# Altium integrated library LEMO Unipole And Multipole Type Connectors.IntLib: 1566 symbols (part 5 of 13) (continued)
## ERA.2E.306.CLN (continued)
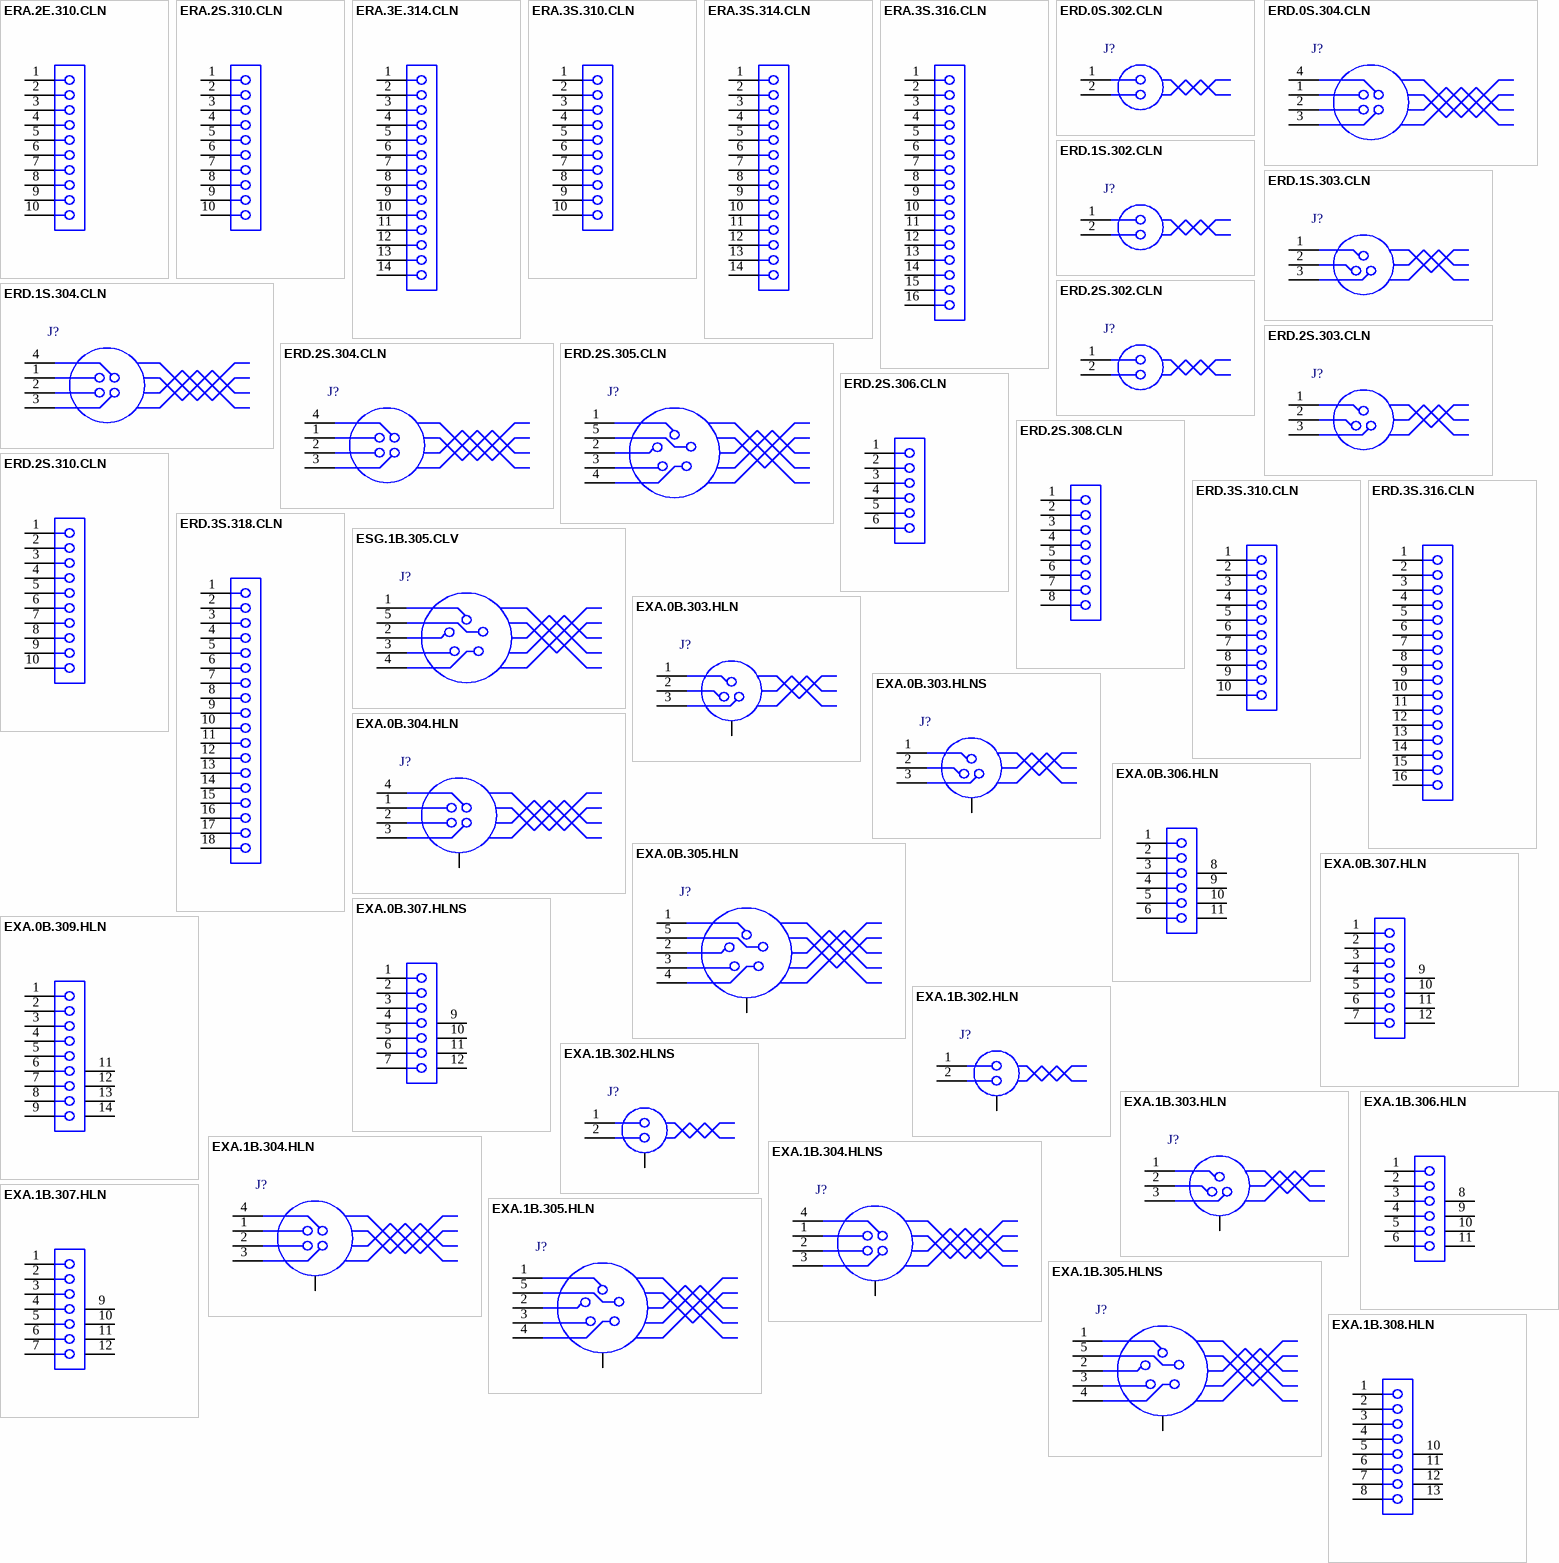
[diagram p15: symbols ERA.2E.310.CLN to EXA.1B.308.HLN]

## ERA.2E.310.CLN
designator J?
Fixed receptacle, nut fixing, Key (A), 2E series, Multipole Type with 10 Contacts; Manufacturer: LEMO; PartNumber: ERA.2E.310.CLN; Number of contacts: 10; Contact Diameter: 0.9 mm; AWG: 22; Rated Current(A): 7; DatasheetVersion: Jun-14; PackageReference: ERA.2E.310.CLN; PackageDescription: Fixed receptacle, nut fixing, Key(A) for Printed Circuit; ComponentLink1Description: Manufacturer URL; ComponentLink1URL: http://www.lemo.com; ComponentLink2Description: Datasheet; ComponentLink2URL: http://intra.lemo.ch/catalog/ROW/UK_English/unipole_multipole.pdf
footprint ERA.2E.310.CLN (Socket, Female, Body 20mm dia., Through hole)
pins: 1, 2, 3, 4, 5, 6, 7, 8, 9, 10

## ERA.2S.310.CLN
designator J?
Fixed receptacle, nut fixing, 2S series, Multipole Type with 10 Contacts; Manufacturer: LEMO; PartNumber: ERA.2S.310.CLN; Number of contacts: 10; Contact Diameter: 0.9 mm; AWG: 22; Rated Current(A): 7; DatasheetVersion: Jun-14; PackageReference: ERA.2S.310.CLN; PackageDescription: Fixed receptacle, nut fixing,  for Printed Circuit; Supplier 1: Mouser; Supplier Part Number 1: 736-ERA2S310CLN; Supplier 2: Digi-Key; Supplier Part Number 2: ERA.2S.310.CLN-ND; ComponentLink1Description: Manufacturer URL; ComponentLink1URL: http://www.lemo.com; ComponentLink2Description: Datasheet; ComponentLink2URL: http://intra.lemo.ch/catalog/ROW/UK_English/unipole_multipole.pdf
footprint ERA.2S.310.CLN (Socket, Female, Body 15mm dia., Through hole)
pins: 1, 2, 3, 4, 5, 6, 7, 8, 9, 10

## ERA.3E.314.CLN
designator J?
Fixed receptacle, nut fixing, Key (A), 3E series, Multipole Type with 14 Contacts; Manufacturer: LEMO; PartNumber: ERA.3E.314.CLN; Number of contacts: 14; Contact Diameter: 0.9 mm; AWG: 22; Rated Current(A): 7; DatasheetVersion: Jun-14; PackageReference: ERA.3E.314.CLN; PackageDescription: Fixed receptacle, nut fixing, Key(A) for Printed Circuit; ComponentLink1Description: Manufacturer URL; ComponentLink1URL: http://www.lemo.com; ComponentLink2Description: Datasheet; ComponentLink2URL: http://intra.lemo.ch/catalog/ROW/UK_English/unipole_multipole.pdf
footprint ERA.3E.314.CLN (Socket, Female, Body 24mm dia., Through hole)
pins: 1, 2, 3, 4, 5, 6, 7, 8, 9, 10, 11, 12, 13, 14

## ERA.3S.310.CLN
designator J?
Fixed receptacle, nut fixing, 3S series, Multipole Type with 10 Contacts; Manufacturer: LEMO; PartNumber: ERA.3S.310.CLN; Number of contacts: 10; Contact Diameter: 1.3 mm; AWG: 20; Rated Current(A): 9; DatasheetVersion: Jun-14; PackageReference: ERA.3S.310.CLN; PackageDescription: Fixed receptacle, nut fixing,  for Printed Circuit; ComponentLink1Description: Manufacturer URL; ComponentLink1URL: http://www.lemo.com; ComponentLink2Description: Datasheet; ComponentLink2URL: http://intra.lemo.ch/catalog/ROW/UK_English/unipole_multipole.pdf
footprint ERA.3S.310.CLN (Socket, Female, Body 18mm dia., Through hole)
pins: 1, 2, 3, 4, 5, 6, 7, 8, 9, 10

## ERA.3S.314.CLN
designator J?
Fixed receptacle, nut fixing, 3S series, Multipole Type with 14 Contacts; Manufacturer: LEMO; PartNumber: ERA.3S.314.CLN; Number of contacts: 14; Contact Diameter: 0.9 mm; AWG: 22; Rated Current(A): 7; DatasheetVersion: Jun-14; PackageReference: ERA.3S.314.CLN; PackageDescription: Fixed receptacle, nut fixing,  for Printed Circuit; ComponentLink1Description: Manufacturer URL; ComponentLink1URL: http://www.lemo.com; ComponentLink2Description: Datasheet; ComponentLink2URL: http://intra.lemo.ch/catalog/ROW/UK_English/unipole_multipole.pdf
footprint ERA.3S.314.CLN (Socket, Female, Body 18mm dia., Through hole)
pins: 1, 2, 3, 4, 5, 6, 7, 8, 9, 10, 11, 12, 13, 14

## ERA.3S.316.CLN
designator J?
Fixed receptacle, nut fixing, 3S series, Multipole Type with 16 Contacts; Manufacturer: LEMO; PartNumber: ERA.3S.316.CLN; Number of contacts: 16; Contact Diameter: 0.9 mm; AWG: 22; Rated Current(A): 7; DatasheetVersion: Jun-14; PackageReference: ERA.3S.316.CLN; PackageDescription: Fixed receptacle, nut fixing,  for Printed Circuit; ComponentLink1Description: Manufacturer URL; ComponentLink1URL: http://www.lemo.com; ComponentLink2Description: Datasheet; ComponentLink2URL: http://intra.lemo.ch/catalog/ROW/UK_English/unipole_multipole.pdf
footprint ERA.3S.316.CLN (Socket, Female, Body 18mm dia., Through hole)
pins: 1, 2, 3, 4, 5, 6, 7, 8, 9, 10, 11, 12, 13, 14, 15, 16

## ERD.0S.302.CLN
designator J?
Fixed receptacle with two nuts (back panel mounting), 0S series, Multipole Type with 2 Contacts; Manufacturer: LEMO; PartNumber: ERD.0S.302.CLN; Number of contacts: 2; Contact Diameter: 0.9 mm; AWG: 22; Rated Current(A): 10; DatasheetVersion: Jun-14; PackageReference: ERD.0S.302.CLN; PackageDescription: Fixed receptacle with two nuts (back panel mounting),  for Printed Circuit; Supplier 1: Mouser; Supplier Part Number 1: 736-ERD0S302CLN; Supplier 2: Digi-Key; Supplier Part Number 2: ERD.0S.302.CLN-ND; ComponentLink1Description: Manufacturer URL; ComponentLink1URL: http://www.lemo.com; ComponentLink2Description: Datasheet; ComponentLink2URL: http://intra.lemo.ch/catalog/ROW/UK_English/unipole_multipole.pdf
footprint ERD.0S.302.CLN (Socket, Female, Body 9mm dia., Through hole)
pins: 1, 2

## ERD.0S.304.CLN
designator J?
Fixed receptacle with two nuts (back panel mounting), 0S series, Multipole Type with 4 Contacts; Manufacturer: LEMO; PartNumber: ERD.0S.304.CLN; Number of contacts: 4; Contact Diameter: 0.7 mm; AWG: 24; Rated Current(A): 7; DatasheetVersion: Jun-14; PackageReference: ERD.0S.304.CLN; PackageDescription: Fixed receptacle with two nuts (back panel mounting),  for Printed Circuit; Supplier 1: Mouser; Supplier Part Number 1: 736-ERD0S304CLN; Supplier 2: Digi-Key; Supplier Part Number 2: ERD.0S.304.CLN-ND; ComponentLink1Description: Manufacturer URL; ComponentLink1URL: http://www.lemo.com; ComponentLink2Description: Datasheet; ComponentLink2URL: http://intra.lemo.ch/catalog/ROW/UK_English/unipole_multipole.pdf
footprint ERD.0S.304.CLN (Socket, Female, Body 9mm dia., Through hole)
pins: 1, 2, 3, 4

## ERD.1S.302.CLN
designator J?
Fixed receptacle with two nuts (back panel mounting), 1S series, Multipole Type with 2 Contacts; Manufacturer: LEMO; PartNumber: ERD.1S.302.CLN; Number of contacts: 2; Contact Diameter: 1.3 mm; AWG: 20; Rated Current(A): 15; DatasheetVersion: Jun-14; PackageReference: ERD.1S.302.CLN; PackageDescription: Fixed receptacle with two nuts (back panel mounting),  for Printed Circuit; Supplier 1: Mouser; Supplier Part Number 1: 736-ERD1S302CLN; Supplier 2: Digi-Key; Supplier Part Number 2: ERD.1S.302.CLN-ND; ComponentLink1Description: Manufacturer URL; ComponentLink1URL: http://www.lemo.com; ComponentLink2Description: Datasheet; ComponentLink2URL: http://intra.lemo.ch/catalog/ROW/UK_English/unipole_multipole.pdf
footprint ERD.1S.302.CLN (Socket, Female, Body 12mm dia., Through hole)
pins: 1, 2

## ERD.1S.303.CLN
designator J?
Fixed receptacle with two nuts (back panel mounting), 1S series, Multipole Type with 3 Contacts; Manufacturer: LEMO; PartNumber: ERD.1S.303.CLN; Number of contacts: 3; Contact Diameter: 0.9 mm; AWG: 22; Rated Current(A): 10; DatasheetVersion: Jun-14; PackageReference: ERD.1S.303.CLN; PackageDescription: Fixed receptacle with two nuts (back panel mounting),  for Printed Circuit; Supplier 1: Mouser; Supplier Part Number 1: 736-ERD1S303CLN; Supplier 2: Digi-Key; Supplier Part Number 2: ERD.1S.303.CLN-ND; ComponentLink1Description: Manufacturer URL; ComponentLink1URL: http://www.lemo.com; ComponentLink2Description: Datasheet; ComponentLink2URL: http://intra.lemo.ch/catalog/ROW/UK_English/unipole_multipole.pdf
footprint ERD.1S.303.CLN (Socket, Female, Body 12mm dia., Through hole)
pins: 1, 2, 3

## ERD.1S.304.CLN
designator J?
Fixed receptacle with two nuts (back panel mounting), 1S series, Multipole Type with 4 Contacts; Manufacturer: LEMO; PartNumber: ERD.1S.304.CLN; Number of contacts: 4; Contact Diameter: 0.9 mm; AWG: 22; Rated Current(A): 10; DatasheetVersion: Jun-14; PackageReference: ERD.1S.304.CLN; PackageDescription: Fixed receptacle with two nuts (back panel mounting),  for Printed Circuit; ComponentLink1Description: Manufacturer URL; ComponentLink1URL: http://www.lemo.com; ComponentLink2Description: Datasheet; ComponentLink2URL: http://intra.lemo.ch/catalog/ROW/UK_English/unipole_multipole.pdf
footprint ERD.1S.304.CLN (Socket, Female, Body 12mm dia., Through hole)
pins: 1, 2, 3, 4

## ERD.2S.302.CLN
designator J?
Fixed receptacle with two nuts (back panel mounting), 2S series, Multipole Type with 2 Contacts; Manufacturer: LEMO; PartNumber: ERD.2S.302.CLN; Number of contacts: 2; AWG: 16; Rated Current(A): 20; DatasheetVersion: Jun-14; PackageReference: ERD.2S.302.CLN; PackageDescription: Fixed receptacle with two nuts (back panel mounting),  for Printed Circuit; ComponentLink1Description: Manufacturer URL; ComponentLink1URL: http://www.lemo.com; ComponentLink2Description: Datasheet; ComponentLink2URL: http://intra.lemo.ch/catalog/ROW/UK_English/unipole_multipole.pdf
footprint ERD.2S.302.CLN (Socket, Female, Body 15mm dia., Through hole)
pins: 1, 2

## ERD.2S.303.CLN
designator J?
Fixed receptacle with two nuts (back panel mounting), 2S series, Multipole Type with 3 Contacts; Manufacturer: LEMO; PartNumber: ERD.2S.303.CLN; Number of contacts: 3; Contact Diameter: 1.3 mm; AWG: 20; Rated Current(A): 15; DatasheetVersion: Jun-14; PackageReference: ERD.2S.303.CLN; PackageDescription: Fixed receptacle with two nuts (back panel mounting),  for Printed Circuit; ComponentLink1Description: Manufacturer URL; ComponentLink1URL: http://www.lemo.com; ComponentLink2Description: Datasheet; ComponentLink2URL: http://intra.lemo.ch/catalog/ROW/UK_English/unipole_multipole.pdf
footprint ERD.2S.303.CLN (Socket, Female, Body 15mm dia., Through hole)
pins: 1, 2, 3

## ERD.2S.304.CLN
designator J?
Fixed receptacle with two nuts (back panel mounting), 2S series, Multipole Type with 4 Contacts; Manufacturer: LEMO; PartNumber: ERD.2S.304.CLN; Number of contacts: 4; Contact Diameter: 1.3 mm; AWG: 20; Rated Current(A): 15; DatasheetVersion: Jun-14; PackageReference: ERD.2S.304.CLN; PackageDescription: Fixed receptacle with two nuts (back panel mounting),  for Printed Circuit; ComponentLink1Description: Manufacturer URL; ComponentLink1URL: http://www.lemo.com; ComponentLink2Description: Datasheet; ComponentLink2URL: http://intra.lemo.ch/catalog/ROW/UK_English/unipole_multipole.pdf
footprint ERD.2S.304.CLN (Socket, Female, Body 15mm dia., Through hole)
pins: 1, 2, 3, 4

## ERD.2S.305.CLN
designator J?
Fixed receptacle with two nuts (back panel mounting), 2S series, Multipole Type with 5 Contacts; Manufacturer: LEMO; PartNumber: ERD.2S.305.CLN; Number of contacts: 5; Contact Diameter: 1.3 mm; AWG: 20; Rated Current(A): 13; DatasheetVersion: Jun-14; PackageReference: ERD.2S.305.CLN; PackageDescription: Fixed receptacle with two nuts (back panel mounting),  for Printed Circuit; ComponentLink1Description: Manufacturer URL; ComponentLink1URL: http://www.lemo.com; ComponentLink2Description: Datasheet; ComponentLink2URL: http://intra.lemo.ch/catalog/ROW/UK_English/unipole_multipole.pdf
footprint ERD.2S.305.CLN (Socket, Female, Body 15mm dia., Through hole)
pins: 1, 2, 3, 4, 5

## ERD.2S.306.CLN
designator J?
Fixed receptacle with two nuts (back panel mounting), 2S series, Multipole Type with 6 Contacts; Manufacturer: LEMO; PartNumber: ERD.2S.306.CLN; Number of contacts: 6; Contact Diameter: 1.3 mm; AWG: 20; Rated Current(A): 12; DatasheetVersion: Jun-14; PackageReference: ERD.2S.306.CLN; PackageDescription: Fixed receptacle with two nuts (back panel mounting),  for Printed Circuit; Supplier 1: Mouser; Supplier Part Number 1: 736-ERD2S306CLN; Supplier 2: Digi-Key; Supplier Part Number 2: ERD.2S.306.CLN-ND; ComponentLink1Description: Manufacturer URL; ComponentLink1URL: http://www.lemo.com; ComponentLink2Description: Datasheet; ComponentLink2URL: http://intra.lemo.ch/catalog/ROW/UK_English/unipole_multipole.pdf
footprint ERD.2S.306.CLN (Socket, Female, Body 15mm dia., Through hole)
pins: 1, 2, 3, 4, 5, 6

## ERD.2S.308.CLN
designator J?
Fixed receptacle with two nuts (back panel mounting), 2S series, Multipole Type with 8 Contacts; Manufacturer: LEMO; PartNumber: ERD.2S.308.CLN; Number of contacts: 8; Contact Diameter: 0.9 mm; AWG: 22; Rated Current(A): 9; DatasheetVersion: Jun-14; PackageReference: ERD.2S.308.CLN; PackageDescription: Fixed receptacle with two nuts (back panel mounting),  for Printed Circuit; ComponentLink1Description: Manufacturer URL; ComponentLink1URL: http://www.lemo.com; ComponentLink2Description: Datasheet; ComponentLink2URL: http://intra.lemo.ch/catalog/ROW/UK_English/unipole_multipole.pdf
footprint ERD.2S.308.CLN (Socket, Female, Body 15mm dia., Through hole)
pins: 1, 2, 3, 4, 5, 6, 7, 8

## ERD.2S.310.CLN
designator J?
Fixed receptacle with two nuts (back panel mounting), 2S series, Multipole Type with 10 Contacts; Manufacturer: LEMO; PartNumber: ERD.2S.310.CLN; Number of contacts: 10; Contact Diameter: 0.9 mm; AWG: 22; Rated Current(A): 7; DatasheetVersion: Jun-14; PackageReference: ERD.2S.310.CLN; PackageDescription: Fixed receptacle with two nuts (back panel mounting),  for Printed Circuit; Supplier 1: Mouser; Supplier Part Number 1: 736-ERD2S310CLN; Supplier 2: Digi-Key; Supplier Part Number 2: ERD.2S.310.CLN-ND; ComponentLink1Description: Manufacturer URL; ComponentLink1URL: http://www.lemo.com; ComponentLink2Description: Datasheet; ComponentLink2URL: http://intra.lemo.ch/catalog/ROW/UK_English/unipole_multipole.pdf
footprint ERD.2S.310.CLN (Socket, Female, Body 15mm dia., Through hole)
pins: 1, 2, 3, 4, 5, 6, 7, 8, 9, 10

## ERD.3S.310.CLN
designator J?
Fixed receptacle with two nuts (back panel mounting), 3S series, Multipole Type with 10 Contacts; Manufacturer: LEMO; PartNumber: ERD.3S.310.CLN; Number of contacts: 10; Contact Diameter: 1.3 mm; AWG: 20; Rated Current(A): 9; DatasheetVersion: Jun-14; PackageReference: ERD.3S.310.CLN; PackageDescription: Fixed receptacle with two nuts (back panel mounting),  for Printed Circuit; Supplier 1: Mouser; Supplier Part Number 1: 736-ERD3S310CLN; Supplier 2: Digi-Key; Supplier Part Number 2: ERD.3S.310.CLN-ND; ComponentLink1Description: Manufacturer URL; ComponentLink1URL: http://www.lemo.com; ComponentLink2Description: Datasheet; ComponentLink2URL: http://intra.lemo.ch/catalog/ROW/UK_English/unipole_multipole.pdf
footprint ERD.3S.310.CLN (Socket, Female, Body 18mm dia., Through hole)
pins: 1, 2, 3, 4, 5, 6, 7, 8, 9, 10

## ERD.3S.316.CLN
designator J?
Fixed receptacle with two nuts (back panel mounting), 3S series, Multipole Type with 16 Contacts; Manufacturer: LEMO; PartNumber: ERD.3S.316.CLN; Number of contacts: 16; Contact Diameter: 0.9 mm; AWG: 22; Rated Current(A): 7; DatasheetVersion: Jun-14; PackageReference: ERD.3S.316.CLN; PackageDescription: Fixed receptacle with two nuts (back panel mounting),  for Printed Circuit; Supplier 1: Mouser; Supplier Part Number 1: 736-ERD3S316CLN; Supplier 2: Digi-Key; Supplier Part Number 2: ERD.3S.316.CLN-ND; ComponentLink1Description: Manufacturer URL; ComponentLink1URL: http://www.lemo.com; ComponentLink2Description: Datasheet; ComponentLink2URL: http://intra.lemo.ch/catalog/ROW/UK_English/unipole_multipole.pdf
footprint ERD.3S.316.CLN (Socket, Female, Body 18mm dia., Through hole)
pins: 1, 2, 3, 4, 5, 6, 7, 8, 9, 10, 11, 12, 13, 14, 15, 16

## ERD.3S.318.CLN
designator J?
Fixed receptacle with two nuts (back panel mounting), 3S series, Multipole Type with 18 Contacts; Manufacturer: LEMO; PartNumber: ERD.3S.318.CLN; Number of contacts: 18; Contact Diameter: 0.9 mm; AWG: 22; Rated Current(A): 6; DatasheetVersion: Jun-14; PackageReference: ERD.3S.318.CLN; PackageDescription: Fixed receptacle with two nuts (back panel mounting),  for Printed Circuit; ComponentLink1Description: Manufacturer URL; ComponentLink1URL: http://www.lemo.com; ComponentLink2Description: Datasheet; ComponentLink2URL: http://intra.lemo.ch/catalog/ROW/UK_English/unipole_multipole.pdf
footprint ERD.3S.318.CLN (Socket, Female, Body 18mm dia., Through hole)
pins: 1, 2, 3, 4, 5, 6, 7, 8, 9, 10, 11, 12, 13, 14, 15, 16, 17, 18

## ESG.1B.305.CLV
designator J?
Fixed receptacle with two round nuts, long threaded shell (back panel mounting), Key (G), 1B series, Multipole Type with 5 Contacts; Manufacturer: LEMO; PartNumber: ESG.1B.305.CLV; Number of contacts: 5; Contact Diameter: 0.9 mm; AWG: 22; Rated Current(A): 6; DatasheetVersion: Jun-14; PackageReference: ESG.1B.305.CLV; PackageDescription: Fixed receptacle with two round nuts, long threaded shell (back panel mounting), Key(G) for Printed Circuit; ComponentLink1Description: Manufacturer URL; ComponentLink1URL: http://www.lemo.com; ComponentLink2Description: Datasheet; ComponentLink2URL: http://intra.lemo.ch/catalog/ROW/UK_English/unipole_multipole.pdf
footprint ESG.1B.305.CLV (Socket, Female, Body 12mm dia. Height 21.1 mm, Through hole)
pins: 1, 2, 3, 4, 5

## EXA.0B.303.HLN
designator J?
Elbow receptacle for printed circuit with two nuts (solder or screw fixing, back panel mounting), Key (A), 0B series, Multipole Type with 3 Contacts; Manufacturer: LEMO; PartNumber: EXA.0B.303.HLN; Number of contacts: 3; Contact Diameter: 0.9 mm; AWG: 22; Rated Current(A): 6; DatasheetVersion: Jun-14; PackageReference: EXA.0B.303.HLN; PackageDescription: Elbow receptacle for printed circuit with two nuts (solder or screw fixing, back panel mounting), Key(A) for Printed Circuit; Supplier 1: Mouser; Supplier Part Number 1: 736-EXA0B303HLN; Supplier 2: Digi-Key; Supplier Part Number 2: EXA.0B.303.HLN-ND; ComponentLink1Description: Manufacturer URL; ComponentLink1URL: http://www.lemo.com; ComponentLink2Description: Datasheet; ComponentLink2URL: http://intra.lemo.ch/catalog/ROW/UK_English/unipole_multipole.pdf
footprint EXA.0B.303.HLN (Socket, Female, Body 9mm dia. Height 10.5 mm, Through hole)
pins: 1, 2, 3, 5, 6, 7, 8

## EXA.0B.303.HLNS
designator J?
Elbow receptacle for printed circuit with two nuts (solder or screw fixing, back panel mounting), Key (A), 0B series, Multipole Type with 3 Contacts; Manufacturer: LEMO; PartNumber: EXA.0B.303.HLNS; Number of contacts: 3; Contact Diameter: 0.9 mm; AWG: 22; Rated Current(A): 6; DatasheetVersion: Jun-14; PackageReference: EXA.0B.303.HLNS; PackageDescription: Elbow receptacle for printed circuit with two nuts (solder or screw fixing, back panel mounting), Key(A) for Printed Circuit; ComponentLink1Description: Manufacturer URL; ComponentLink1URL: http://www.lemo.com; ComponentLink2Description: Datasheet; ComponentLink2URL: http://intra.lemo.ch/catalog/ROW/UK_English/unipole_multipole.pdf
footprint EXA.0B.303.HLNS (Socket, Female, Body 9mm dia. Height 10.5 mm, Through hole)
pins: 1, 2, 3, 5, 6, 7, 8

## EXA.0B.304.HLN
designator J?
Elbow receptacle for printed circuit with two nuts (solder or screw fixing, back panel mounting), Key (A), 0B series, Multipole Type with 4 Contacts; Manufacturer: LEMO; PartNumber: EXA.0B.304.HLN; Number of contacts: 4; Contact Diameter: 0.7 mm; AWG: 24; Rated Current(A): 6; DatasheetVersion: Jun-14; PackageReference: EXA.0B.304.HLN; PackageDescription: Elbow receptacle for printed circuit with two nuts (solder or screw fixing, back panel mounting), Key(A) for Printed Circuit; Supplier 1: Mouser; Supplier Part Number 1: 736-EXA0B304HLN; Supplier 2: Digi-Key; Supplier Part Number 2: EXA.0B.304.HLN-ND; ComponentLink1Description: Manufacturer URL; ComponentLink1URL: http://www.lemo.com; ComponentLink2Description: Datasheet; ComponentLink2URL: http://intra.lemo.ch/catalog/ROW/UK_English/unipole_multipole.pdf
footprint EXA.0B.304.HLN (Socket, Female, Body 9mm dia. Height 10.5 mm, Through hole)
pins: 1, 2, 3, 4, 6, 7, 8, 9

## EXA.0B.305.HLN
designator J?
Elbow receptacle for printed circuit with two nuts (solder or screw fixing, back panel mounting), Key (A), 0B series, Multipole Type with 5 Contacts; Manufacturer: LEMO; PartNumber: EXA.0B.305.HLN; Number of contacts: 5; Contact Diameter: 0.7 mm; AWG: 24; Rated Current(A): 6; DatasheetVersion: Jun-14; PackageReference: EXA.0B.305.HLN; PackageDescription: Elbow receptacle for printed circuit with two nuts (solder or screw fixing, back panel mounting), Key(A) for Printed Circuit; ComponentLink1Description: Manufacturer URL; ComponentLink1URL: http://www.lemo.com; ComponentLink2Description: Datasheet; ComponentLink2URL: http://intra.lemo.ch/catalog/ROW/UK_English/unipole_multipole.pdf
footprint EXA.0B.305.HLN (Socket, Female, Body 9mm dia. Height 10.5 mm, Through hole)
pins: 1, 2, 3, 4, 5, 7, 8, 9, 10

## EXA.0B.306.HLN
designator J?
Elbow receptacle for printed circuit with two nuts (solder or screw fixing, back panel mounting), Key (A), 0B series, Multipole Type with 6 Contacts; Manufacturer: LEMO; PartNumber: EXA.0B.306.HLN; Number of contacts: 6; Contact Diameter: 0.5 mm; AWG: 28; Rated Current(A): 2.5.; DatasheetVersion: Jun-14; PackageReference: EXA.0B.306.HLN; PackageDescription: Elbow receptacle for printed circuit with two nuts (solder or screw fixing, back panel mounting), Key(A) for Printed Circuit; ComponentLink1Description: Manufacturer URL; ComponentLink1URL: http://www.lemo.com; ComponentLink2Description: Datasheet; ComponentLink2URL: http://intra.lemo.ch/catalog/ROW/UK_English/unipole_multipole.pdf
footprint EXA.0B.306.HLN (Socket, Female, Body 9mm dia. Height 10.5 mm, Through hole)
pins: 1, 2, 3, 4, 5, 6, 8, 9, 10, 11

## EXA.0B.307.HLN
designator J?
Elbow receptacle for printed circuit with two nuts (solder or screw fixing, back panel mounting), Key (A), 0B series, Multipole Type with 7 Contacts; Manufacturer: LEMO; PartNumber: EXA.0B.307.HLN; Number of contacts: 7; Contact Diameter: 0.5 mm; AWG: 28; Rated Current(A): 2; DatasheetVersion: Jun-14; PackageReference: EXA.0B.307.HLN; PackageDescription: Elbow receptacle for printed circuit with two nuts (solder or screw fixing, back panel mounting), Key(A) for Printed Circuit; ComponentLink1Description: Manufacturer URL; ComponentLink1URL: http://www.lemo.com; ComponentLink2Description: Datasheet; ComponentLink2URL: http://intra.lemo.ch/catalog/ROW/UK_English/unipole_multipole.pdf
footprint EXA.0B.307.HLN (Socket, Female, Body 9mm dia. Height 10.5 mm, Through hole)
pins: 1, 2, 3, 4, 5, 6, 7, 9, 10, 11, 12

## EXA.0B.307.HLNS
designator J?
Elbow receptacle for printed circuit with two nuts (solder or screw fixing, back panel mounting), Key (A), 0B series, Multipole Type with 7 Contacts; Manufacturer: LEMO; PartNumber: EXA.0B.307.HLNS; Number of contacts: 7; Contact Diameter: 0.5 mm; AWG: 28; Rated Current(A): 2; DatasheetVersion: Jun-14; PackageReference: EXA.0B.307.HLNS; PackageDescription: Elbow receptacle for printed circuit with two nuts (solder or screw fixing, back panel mounting), Key(A) for Printed Circuit; ComponentLink1Description: Manufacturer URL; ComponentLink1URL: http://www.lemo.com; ComponentLink2Description: Datasheet; ComponentLink2URL: http://intra.lemo.ch/catalog/ROW/UK_English/unipole_multipole.pdf
footprint EXA.0B.307.HLNS (Socket, Female, Body 9mm dia. Height 10.5 mm, Through hole)
pins: 1, 2, 3, 4, 5, 6, 7, 9, 10, 11, 12

## EXA.0B.309.HLN
designator J?
Elbow receptacle for printed circuit with two nuts (solder or screw fixing, back panel mounting), Key (A), 0B series, Multipole Type with 9 Contacts; Manufacturer: LEMO; PartNumber: EXA.0B.309.HLN; Number of contacts: 9; Contact Diameter: 0.5 mm; AWG: 28; Rated Current(A): 1.5.; DatasheetVersion: Jun-14; PackageReference: EXA.0B.309.HLN; PackageDescription: Elbow receptacle for printed circuit with two nuts (solder or screw fixing, back panel mounting), Key(A) for Printed Circuit; Supplier 1: Mouser; Supplier Part Number 1: N/A; ComponentLink1Description: Manufacturer URL; ComponentLink1URL: http://www.lemo.com; ComponentLink2Description: Datasheet; ComponentLink2URL: http://intra.lemo.ch/catalog/ROW/UK_English/unipole_multipole.pdf
footprint EXA.0B.309.HLN (Socket, Female, Body 9mm dia. Height 10.5 mm, Through hole)
pins: 1, 2, 3, 4, 5, 6, 7, 8, 9, 11, 12, 13, 14

## EXA.1B.302.HLN
designator J?
Elbow receptacle for printed circuit with two nuts (solder or screw fixing, back panel mounting), Key (A), 1B series, Multipole Type with 2 Contacts; Manufacturer: LEMO; PartNumber: EXA.1B.302.HLN; Number of contacts: 2; Contact Diameter: 1.3 mm; AWG: 20; Rated Current(A): 12; DatasheetVersion: Jun-14; PackageReference: EXA.1B.302.HLN; PackageDescription: Elbow receptacle for printed circuit with two nuts (solder or screw fixing, back panel mounting), Key(A) for Printed Circuit; Supplier 1: Mouser; Supplier Part Number 1: 736-EXA1B302HLN; Supplier 2: Digi-Key; Supplier Part Number 2: EXA.1B.302.HLN-ND; ComponentLink1Description: Manufacturer URL; ComponentLink1URL: http://www.lemo.com; ComponentLink2Description: Datasheet; ComponentLink2URL: http://intra.lemo.ch/catalog/ROW/UK_English/unipole_multipole.pdf
footprint EXA.1B.302.HLN (Socket, Female, Body 11mm dia. Height 14 mm, Through hole)
pins: 1, 2, 4, 5, 6, 7

## EXA.1B.302.HLNS
designator J?
Elbow receptacle for printed circuit with two nuts (solder or screw fixing, back panel mounting), Key (A), 1B series, Multipole Type with 2 Contacts; Manufacturer: LEMO; PartNumber: EXA.1B.302.HLNS; Number of contacts: 2; Contact Diameter: 1.3 mm; AWG: 20; Rated Current(A): 12; DatasheetVersion: Jun-14; PackageReference: EXA.1B.302.HLNS; PackageDescription: Elbow receptacle for printed circuit with two nuts (solder or screw fixing, back panel mounting), Key(A) for Printed Circuit; ComponentLink1Description: Manufacturer URL; ComponentLink1URL: http://www.lemo.com; ComponentLink2Description: Datasheet; ComponentLink2URL: http://intra.lemo.ch/catalog/ROW/UK_English/unipole_multipole.pdf
footprint EXA.1B.302.HLNS (Socket, Female, Body 11mm dia. Height 14 mm, Through hole)
pins: 1, 2, 4, 5, 6, 7

## EXA.1B.303.HLN
designator J?
Elbow receptacle for printed circuit with two nuts (solder or screw fixing, back panel mounting), Key (A), 1B series, Multipole Type with 3 Contacts; Manufacturer: LEMO; PartNumber: EXA.1B.303.HLN; Number of contacts: 3; Contact Diameter: 1.3 mm; AWG: 20; Rated Current(A): 4.5.; DatasheetVersion: Jun-14; PackageReference: EXA.1B.303.HLN; PackageDescription: Elbow receptacle for printed circuit with two nuts (solder or screw fixing, back panel mounting), Key(A) for Printed Circuit; Supplier 1: Mouser; Supplier Part Number 1: 736-EXA1B303HLN; Supplier 2: Digi-Key; Supplier Part Number 2: EXA.1B.303.HLN-ND; ComponentLink1Description: Manufacturer URL; ComponentLink1URL: http://www.lemo.com; ComponentLink2Description: Datasheet; ComponentLink2URL: http://intra.lemo.ch/catalog/ROW/UK_English/unipole_multipole.pdf
footprint EXA.1B.303.HLN (Socket, Female, Body 11mm dia. Height 14 mm, Through hole)
pins: 1, 2, 3, 5, 6, 7, 8

## EXA.1B.304.HLN
designator J?
Elbow receptacle for printed circuit with two nuts (solder or screw fixing, back panel mounting), Key (A), 1B series, Multipole Type with 4 Contacts; Manufacturer: LEMO; PartNumber: EXA.1B.304.HLN; Number of contacts: 4; Contact Diameter: 0.9 mm; AWG: 22; Rated Current(A): 6; DatasheetVersion: Jun-14; PackageReference: EXA.1B.304.HLN; PackageDescription: Elbow receptacle for printed circuit with two nuts (solder or screw fixing, back panel mounting), Key(A) for Printed Circuit; Supplier 1: Mouser; Supplier Part Number 1: 736-EXA1B304HLN; Supplier 2: Digi-Key; Supplier Part Number 2: EXA.1B.304.HLN-ND; ComponentLink1Description: Manufacturer URL; ComponentLink1URL: http://www.lemo.com; ComponentLink2Description: Datasheet; ComponentLink2URL: http://intra.lemo.ch/catalog/ROW/UK_English/unipole_multipole.pdf
footprint EXA.1B.304.HLN (Socket, Female, Body 11mm dia. Height 14 mm, Through hole)
pins: 1, 2, 3, 4, 6, 7, 8, 9

## EXA.1B.304.HLNS
designator J?
Elbow receptacle for printed circuit with two nuts (solder or screw fixing, back panel mounting), Key (A), 1B series, Multipole Type with 4 Contacts; Manufacturer: LEMO; PartNumber: EXA.1B.304.HLNS; Number of contacts: 4; Contact Diameter: 0.9 mm; AWG: 22; Rated Current(A): 6; DatasheetVersion: Jun-14; PackageReference: EXA.1B.304.HLNS; PackageDescription: Elbow receptacle for printed circuit with two nuts (solder or screw fixing, back panel mounting), Key(A) for Printed Circuit; ComponentLink1Description: Manufacturer URL; ComponentLink1URL: http://www.lemo.com; ComponentLink2Description: Datasheet; ComponentLink2URL: http://intra.lemo.ch/catalog/ROW/UK_English/unipole_multipole.pdf
footprint EXA.1B.304.HLNS (Socket, Female, Body 11mm dia. Height 14 mm, Through hole)
pins: 1, 2, 3, 4, 6, 7, 8, 9

## EXA.1B.305.HLN
designator J?
Elbow receptacle for printed circuit with two nuts (solder or screw fixing, back panel mounting), Key (A), 1B series, Multipole Type with 5 Contacts; Manufacturer: LEMO; PartNumber: EXA.1B.305.HLN; Number of contacts: 5; Contact Diameter: 0.9 mm; AWG: 22; Rated Current(A): 6; DatasheetVersion: Jun-14; PackageReference: EXA.1B.305.HLN; PackageDescription: Elbow receptacle for printed circuit with two nuts (solder or screw fixing, back panel mounting), Key(A) for Printed Circuit; Supplier 1: Mouser; Supplier Part Number 1: 736-EXA1B305HLN; Supplier 2: Digi-Key; Supplier Part Number 2: EXA.1B.305.HLN-ND; ComponentLink1Description: Manufacturer URL; ComponentLink1URL: http://www.lemo.com; ComponentLink2Description: Datasheet; ComponentLink2URL: http://intra.lemo.ch/catalog/ROW/UK_English/unipole_multipole.pdf
footprint EXA.1B.305.HLN (Socket, Female, Body 11mm dia. Height 14 mm, Through hole)
pins: 1, 2, 3, 4, 5, 7, 8, 9, 10

## EXA.1B.305.HLNS
designator J?
Elbow receptacle for printed circuit with two nuts (solder or screw fixing, back panel mounting), Key (A), 1B series, Multipole Type with 5 Contacts; Manufacturer: LEMO; PartNumber: EXA.1B.305.HLNS; Number of contacts: 5; Contact Diameter: 0.9 mm; AWG: 22; Rated Current(A): 6; DatasheetVersion: Jun-14; PackageReference: EXA.1B.305.HLNS; PackageDescription: Elbow receptacle for printed circuit with two nuts (solder or screw fixing, back panel mounting), Key(A) for Printed Circuit; ComponentLink1Description: Manufacturer URL; ComponentLink1URL: http://www.lemo.com; ComponentLink2Description: Datasheet; ComponentLink2URL: http://intra.lemo.ch/catalog/ROW/UK_English/unipole_multipole.pdf
footprint EXA.1B.305.HLNS (Socket, Female, Body 11mm dia. Height 14 mm, Through hole)
pins: 1, 2, 3, 4, 5, 7, 8, 9, 10

## EXA.1B.306.HLN
designator J?
Elbow receptacle for printed circuit with two nuts (solder or screw fixing, back panel mounting), Key (A), 1B series, Multipole Type with 6 Contacts; Manufacturer: LEMO; PartNumber: EXA.1B.306.HLN; Number of contacts: 6; Contact Diameter: 0.7 mm; AWG: 24; DatasheetVersion: Jun-14; PackageReference: EXA.1B.306.HLN; PackageDescription: Elbow receptacle for printed circuit with two nuts (solder or screw fixing, back panel mounting), Key(A) for Printed Circuit; Supplier 1: Mouser; Supplier Part Number 1: 736-EXA1B306HLN; Supplier 2: Digi-Key; Supplier Part Number 2: EXA.1B.306.HLN-ND; Rated Current(A): 6; ComponentLink1Description: Manufacturer URL; ComponentLink1URL: http://www.lemo.com; ComponentLink2Description: Datasheet; ComponentLink2URL: http://intra.lemo.ch/catalog/ROW/UK_English/unipole_multipole.pdf
footprint EXA.1B.306.HLN (Socket, Female, Body 11mm dia. Height 14 mm, Through hole)
pins: 1, 2, 3, 4, 5, 6, 8, 9, 10, 11
